# Altium footprint library rescap.PcbLib: 85 footprints (part 2 of 6)
Each footprint in its own frame and in the unit in brackets; x right, y up, seen from the top. Pads: shape width x height; smd on the part's side, far side on the other; paste and mask are expansions set on the pad; w line width, h text height; cw(c..) or ccw(c..) is an arc to the next point about the centre after c.
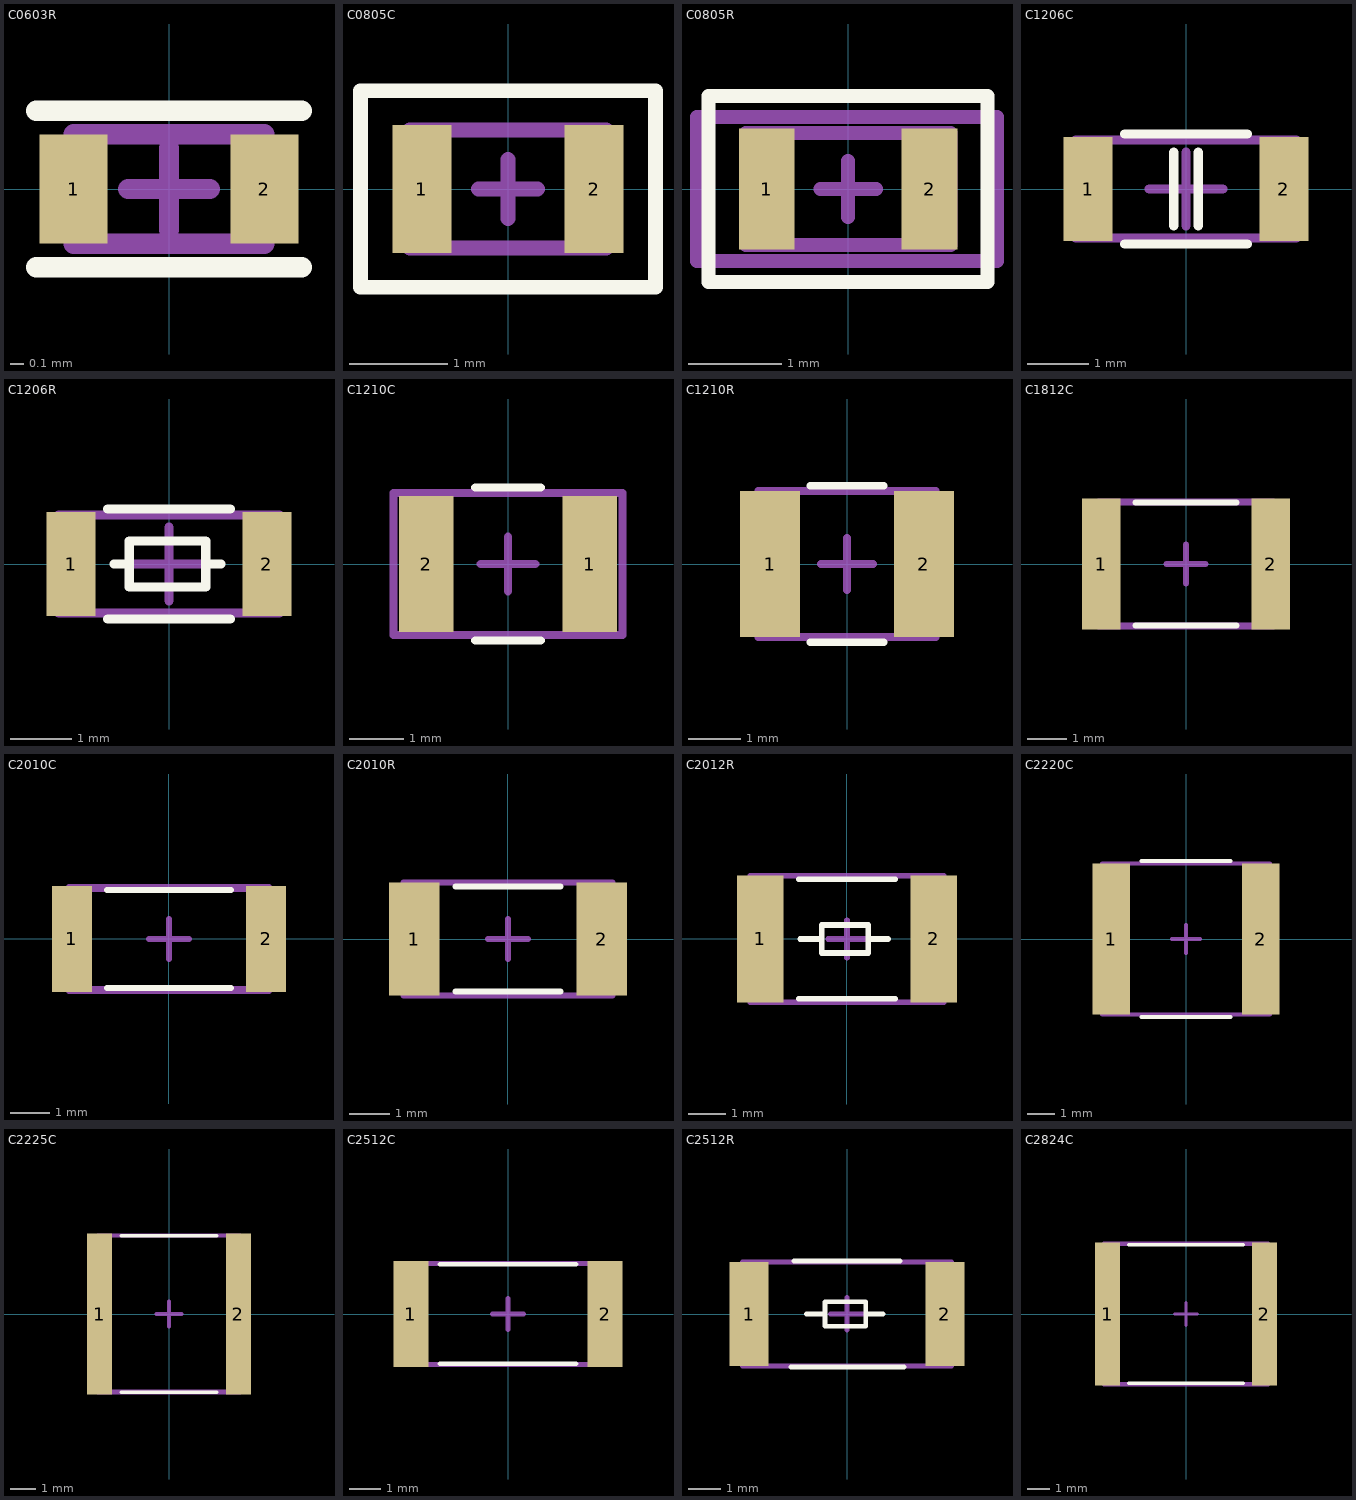
[diagram p1: the footprints below, top view; thin cyan lines are the x and y axes]

## C0603R [mm]
height 0.45
pads (2):
  rect 0.5x0.8 smd: 1(-0.7,0) 2(0.7,0)
Top Overlay:
  lines w0.15: -0.975,-0.575 0.975,-0.575 ; -0.975,0.575 0.975,0.575
Top Courtyard:
  lines w0.15: -0.3,0 0.3,0 ; 0,-0.3 0,0.3 ; -0.7,-0.4 0.7,-0.4 0.7,0.4 -0.7,0.4 -0.7,-0.4
3D body: height 0.45, standoff 0, extent -0.7,-0.41 -0.5,0.41
3D body: height 0.45, standoff 0, extent 0.5,-0.41 0.7,0.41
3D body: height 0.45, standoff 0, extent -0.5,-0.41 0.5,0.41

## C0805C [mm]
height 1
pads (2):
  rect 0.6x1.3 smd: 1(-0.875,0) 2(0.875,0)
Top Overlay:
  lines w0.15: -1.5,-1 -1.5,-0.6 -1.5,-0.5 -1.5,0.5 -1.5,1 -0.6,1 0.2,1 1.5,1 1.5,0.3 1.5,-0.5 1.5,-1 0.6,-1 -0.2,-1 -1.5,-1
Top Courtyard:
  lines w0.15: -0.3,0 0.3,0 ; 0,-0.3 0,0.3 ; -1,-0.6 -1,0.6 1,0.6 1,-0.6 -1,-0.6
3D body: height 0.8, standoff 0, extent 0.4,-0.6 1,0.6
3D body: height 0.8, standoff 0, extent -0.4,-0.6 0.4,0.6
3D body: height 0.8, standoff 0, extent -1,-0.6 -0.4,0.6

## C0805R [mm]
height 1
pads (2):
  rect 0.6x1.3 smd: 1(-0.875,0) 2(0.875,0)
Top Overlay:
  lines w0.15: -1.5,-1 -1.5,-0.6 -1.5,-0.5 -1.5,0.5 -1.5,1 -0.6,1 0.2,1 1.5,1 1.5,0.3 1.5,-0.5 1.5,-1 0.6,-1 -0.2,-1 -1.5,-1
Top Courtyard:
  lines w0.15: -0.3,0 0.3,0 ; 0,-0.3 0,0.3 ; -1.1,-0.6 -1.1,0.6 1.1,0.6 1.1,-0.6 -1.1,-0.6
Mechanical 29:
  lines w0.15: -1.625,-0.775 1.6,-0.775 1.6,0.775 -1.625,0.775 -1.625,-0.775
  text ".Designator" at -1.5,-0.5 h1
3D body: height 0.5, standoff 0, extent -1,-0.6 -0.4,0.6
3D body: height 0.5, standoff 0, extent -0.4,-0.6 0.4,0.6
3D body: height 0.5, standoff 0, extent 0.4,-0.6 1,0.6

## C1206C [mm]
pads (2):
  rect 0.8x1.7 smd: 1(-1.6,0) 2(1.6,0)
Top Overlay:
  lines w0.15: -1,-0.9 1,-0.9 ; -1,0.9 1,0.9 ; -0.2,-0.6 -0.2,0.6 ; 0.2,-0.6 0.2,0.6
Top Courtyard:
  lines w0.15: -0.6,0 0.6,0 ; 0,-0.6 0,0.6 ; -1.8,-0.8 -1.8,0.8 1.8,0.8 1.8,-0.8 -1.8,-0.8
3D body: height 0.8, standoff 0, extent -1.7,-0.8 -0.9,0.8
3D body: height 0.8, standoff 0, extent -0.9,-0.8 0.9,0.8
3D body: height 0.8, standoff 0, extent 0.9,-0.8 1.7,0.8

## C1206R [mm]
pads (2):
  rect 0.8x1.7 smd: 1(-1.6,0) 2(1.6,0)
Top Overlay:
  lines w0.15: -1,-0.9 1,-0.9 ; -1,0.9 1,0.9 ; -0.9,0 -0.65,0 ; 0.85,0 0.6,0 ; -0.65,0 -0.65,0.375 0.6,0.375 0.6,0 ; -0.65,0 -0.65,-0.375 0.6,-0.375 0.6,0
Top Courtyard:
  lines w0.15: -0.6,0 0.6,0 ; 0,-0.6 0,0.6 ; -1.8,-0.8 1.8,-0.8 1.8,0.8 -1.8,0.8 -1.8,-0.8
3D body: height 0.8, standoff 0, extent -1.7,-0.8 -0.9,0.8
3D body: height 0.8, standoff 0, extent -0.9,-0.8 0.9,0.8
3D body: height 0.8, standoff 0, extent 0.9,-0.8 1.7,0.8

## C1210C [mm] "Chip Capacitor, 2-Leads, Body 3,2x2,5mm, IPC Medium Density"
height 0.7
pads (2):
  rect 1x2.5 smd: 1(1.5,0) 2(-1.5,0)
Top Overlay:
  lines w0.15: -0.6,-1.4 0.6,-1.4 ; -0.6,1.4 0.6,1.4
Top Courtyard:
  lines w0.15: -0.5,0 0.5,0 ; 0,-0.5 0,0.5 ; -2.1,-1.3 2.1,-1.3 2.1,1.3 -2.1,1.3 -2.1,-1.3
3D body: height 1.6, standoff 0, extent 0.9,-1.3 2,1.3
3D body: height 1.6, standoff 0, extent -0.9,-1.3 0.9,1.3
3D body: height 1.6, standoff 0, extent -2,-1.3 -0.9,1.3

## C1210R [mm]
height 0.7
pads (2):
  rect 1.15x2.8 smd: 1(-1.475,0) 2(1.475,0)
Top Overlay:
  lines w0.15: -0.7,-1.5 0.7,-1.5 ; -0.7,1.5 0.7,1.5
Top Courtyard:
  lines w0.15: -0.5,0 0.5,0 ; 0,-0.5 0,0.5 ; -1.7,-1.4 -1.7,1.4 1.7,1.4 1.7,-1.4 -1.7,-1.4
Mechanical 29:
  lines w0.15: -1.7,-1.4 -1.7,1.4 1.7,1.4 1.7,-1.4 -1.7,-1.4
  text ".Designator" at -1.5,-0.4 h1
3D body "C1210R.step": height 0.7, standoff 0, extent -1.7,-1.4 1.7,1.4

## C1812C [mm]
height 1
pads (2):
  rect 1x3.35 smd: 1(-2.175,0) 2(2.175,0)
Top Overlay:
  lines w0.15: -1.3,-1.575 1.3,-1.575 ; -1.3,1.575 1.3,1.575
Top Courtyard:
  lines w0.15: -0.5,0 0.5,0 ; 0,-0.5 0,0.5 ; -2.3,-1.575 2.3,-1.575 2.3,1.575 -2.3,1.575 -2.3,-1.575
Mechanical 29:
  lines w0.15: -2.25,-1.6 2.25,-1.6 2.25,1.6 -2.25,1.6 -2.25,-1.6
  text ".Designator" at -2,-0.4 h1
3D body "C1812C.step": height 1, standoff 0, extent -2.25,-1.6 2.25,1.6

## C2010C [mm] "Chip2PinSM127P600-8N"
height 0.55
pads (2):
  rect 1x2.65 smd: 1(-2.425,0) 2(2.425,0)
Top Overlay:
  lines w0.15: -1.55,-1.225 1.55,-1.225 ; -1.55,1.225 1.55,1.225
Top Courtyard:
  lines w0.15: -0.5,0 0.5,0 ; 0,-0.5 0,0.5 ; -2.5,-1.3 -2.5,1.3 2.5,1.3 2.5,-1.3 -2.5,-1.3
Mechanical 29:
  lines w0.15: -2.5,-1.25 -2.5,1.25 2.5,1.25 2.5,-1.25 -2.5,-1.25
  text ".Designator" at -2.2,-0.3 h1
3D body "C2010C.step": height 0.55, standoff 0, extent -2.5,-1.25 2.5,1.25

## C2010R [mm]
height 0.7
pads (2):
  rect 1.25x2.8 smd: 1(-2.325,0) 2(2.325,0)
Top Overlay:
  lines w0.15: -1.3,-1.3 1.3,-1.3 ; -1.3,1.3 1.3,1.3
Top Courtyard:
  lines w0.15: -0.5,0 0.5,0 ; 0,-0.5 0,0.5 ; -2.6,-1.4 2.6,-1.4 2.6,1.4 -2.6,1.4 -2.6,-1.4
Mechanical 29:
  lines w0.15: -2.6,-1.4 2.6,-1.4 2.6,1.4 -2.6,1.4 -2.6,-1.4
  text ".Designator" at -2.2,-0.5 h1
3D body "C2010R.step": height 0.7, standoff 0, extent -2.6,-1.4 2.6,1.4

## C2012R [mm]
height 0.7
pads (2):
  rect 1.25x3.4 smd: 1(-2.325,0) 2(2.325,0)
Top Overlay:
  lines w0.15: -1.3,-1.6 1.3,-1.6 ; -1.3,1.6 1.3,1.6 ; -1.25,0 -0.675,0 ; 1.1,0 0.575,0 ; -0.675,0 -0.675,0.375 0.575,0.375 0.575,0 ; -0.675,0 -0.675,-0.375 0.575,-0.375 0.575,0
Top Courtyard:
  lines w0.15: -0.5,0 0.5,0 ; 0,-0.5 0,0.5 ; -2.6,-1.7 2.6,-1.7 2.6,1.7 -2.6,1.7 -2.6,-1.7
Mechanical 29:
  lines w0.15: -2.6,-1.7 2.6,-1.7 2.6,1.7 -2.6,1.7 -2.6,-1.7
  text ".Designator" at -2.2,-0.4 h1
3D body "C2012R.step": height 0.7, standoff 0, extent -2.6,-1.7 2.6,1.7

## C2220C [mm] "Chip Capacitor, 2-Leads, Body 5,65x5,00mm, IPC Medium Density"
height 2.5
pads (2):
  rect 1.35x5.4 smd: 1(-2.675,0) 2(2.675,0)
Top Overlay:
  lines w0.15: -1.6,-2.8 1.6,-2.8 ; -1.6,2.8 1.6,2.8
Top Courtyard:
  lines w0.15: -0.5,0 0.5,0 ; 0,-0.5 0,0.5 ; -3,-2.7 3,-2.7 3,2.7 -3,2.7 -3,-2.7
Mechanical 29:
  lines w0.15: -3,-2.7 3,-2.7 3,2.7 -3,2.7 -3,-2.7
  text ".Designator" at -2.5,-0.4 h1
3D body "C2220C.step": height 2.5, standoff 0, extent -3,-2.7 3,2.7

## C2225C [mm] "Chip2PinSM127P600-8N"
height 2
pads (2):
  rect 1x6.45 smd: 1(-2.775,0) 2(2.775,0)
Top Overlay:
  lines w0.15: -1.9,-3.125 1.9,-3.125 ; -1.9,3.125 1.9,3.125
Top Courtyard:
  lines w0.15: -0.5,0 0.5,0 ; 0,-0.5 0,0.5 ; -2.9,-3.1 2.9,-3.1 2.9,3.125 -2.9,3.125 -2.9,-3.1
Mechanical 29:
  lines w0.15: -2.85,-3.15 2.85,-3.15 2.85,3.15 -2.85,3.15 -2.85,-3.15
  text ".Designator" at -2.6,-0.4 h1
3D body "C2225C.step": height 2, standoff 0, extent -2.85,-3.15 2.85,3.15

## C2512C [mm] "Chip Capacitor, 2-Leads, Body 6,40x3,20mm, IPC Medium Density"
height 2
pads (2):
  rect 1.1x3.35 smd: 1(-3.075,0) 2(3.075,0)
Top Overlay:
  lines w0.15: -2.15,-1.575 2.15,-1.575 ; -2.15,1.575 2.15,1.575
Top Courtyard:
  lines w0.15: -0.5,0 0.5,0 ; 0,-0.5 0,0.5 ; -3.2,-1.6 -3.2,1.6 3.2,1.6 3.2,-1.6 -3.2,-1.6
Mechanical 29:
  lines w0.15: -3.2,-1.6 -3.2,1.6 3.2,1.6 3.2,-1.6 -3.2,-1.6
  text ".Designator" at -2.6,-0.3 h1
3D body "C2512C.step": height 2, standoff 0, extent -3.2,-1.6 3.2,1.6

## C2512R [mm] "Chip Resistor, 2-Leads, Body 6,3x3,2mm, IPC Low Density"
height 0.55
pads (2):
  rect 1.2x3.2 smd: 1(-3,0) 2(3,0)
Top Overlay:
  lines w0.15: -1.725,-1.625 1.75,-1.625 ; -1.625,1.625 1.625,1.625 ; -1.25,0 -0.675,0 ; 1.1,0 0.575,0 ; -0.675,0 -0.675,0.375 0.575,0.375 0.575,0 ; -0.675,0 -0.675,-0.375 0.575,-0.375 0.575,0
Top Courtyard:
  lines w0.15: -0.5,0 0.5,0 ; 0,-0.5 0,0.5 ; -3.2,-1.6 -3.2,1.6 3.2,1.6 3.2,-1.6 -3.2,-1.6
Mechanical 29:
  lines w0.15: -3.175,-1.6 -3.175,1.6 3.175,1.6 3.175,-1.6 -3.175,-1.6
  text ".Designator" at -3,-0.4 h1
3D body: height 0.55, standoff 0, extent -2.5,-1.6 2.5,1.6
3D body: height 0.55, standoff 0, extent 2.5,-1.6 3.2,1.6
3D body: height 0.55, standoff 0, extent -3.2,-1.6 -2.5,1.6

## C2824C [mm] "Chip Capacitor, 2-Leads, Body 7,10x6,10mm, IPC Medium Density"
height 3.9
pads (2):
  rect 1.1x6.25 smd: 1(-3.425,0) 2(3.425,0)
Top Overlay:
  lines w0.15: -2.5,-3.025 2.5,-3.025 ; -2.5,3.025 2.5,3.025
Top Courtyard:
  lines w0.15: -0.5,0 0.5,0 ; 0,-0.5 0,0.5 ; -3.6,-3.1 3.6,-3.1 3.6,3.1 -3.6,3.1 -3.6,-3.1
Mechanical 29:
  lines w0.15: -3.55,-3.05 3.55,-3.05 3.55,3.05 -3.55,3.05 -3.55,-3.05
  text ".Designator" at -3.1,-0.3 h1
3D body "C2824C.step": height 3.9, standoff 0, extent -3.55,-3.05 3.55,3.05